# Altium footprint library Pin Header.PcbLib: 138 footprints (part 9 of 9)
Each footprint in its own frame and in the unit in brackets; x right, y up, seen from the top. Pads: shape width x height; smd on the part's side, far side on the other; paste and mask are expansions set on the pad; w line width, h text height; cw(c..) or ccw(c..) is an arc to the next point about the centre after c.
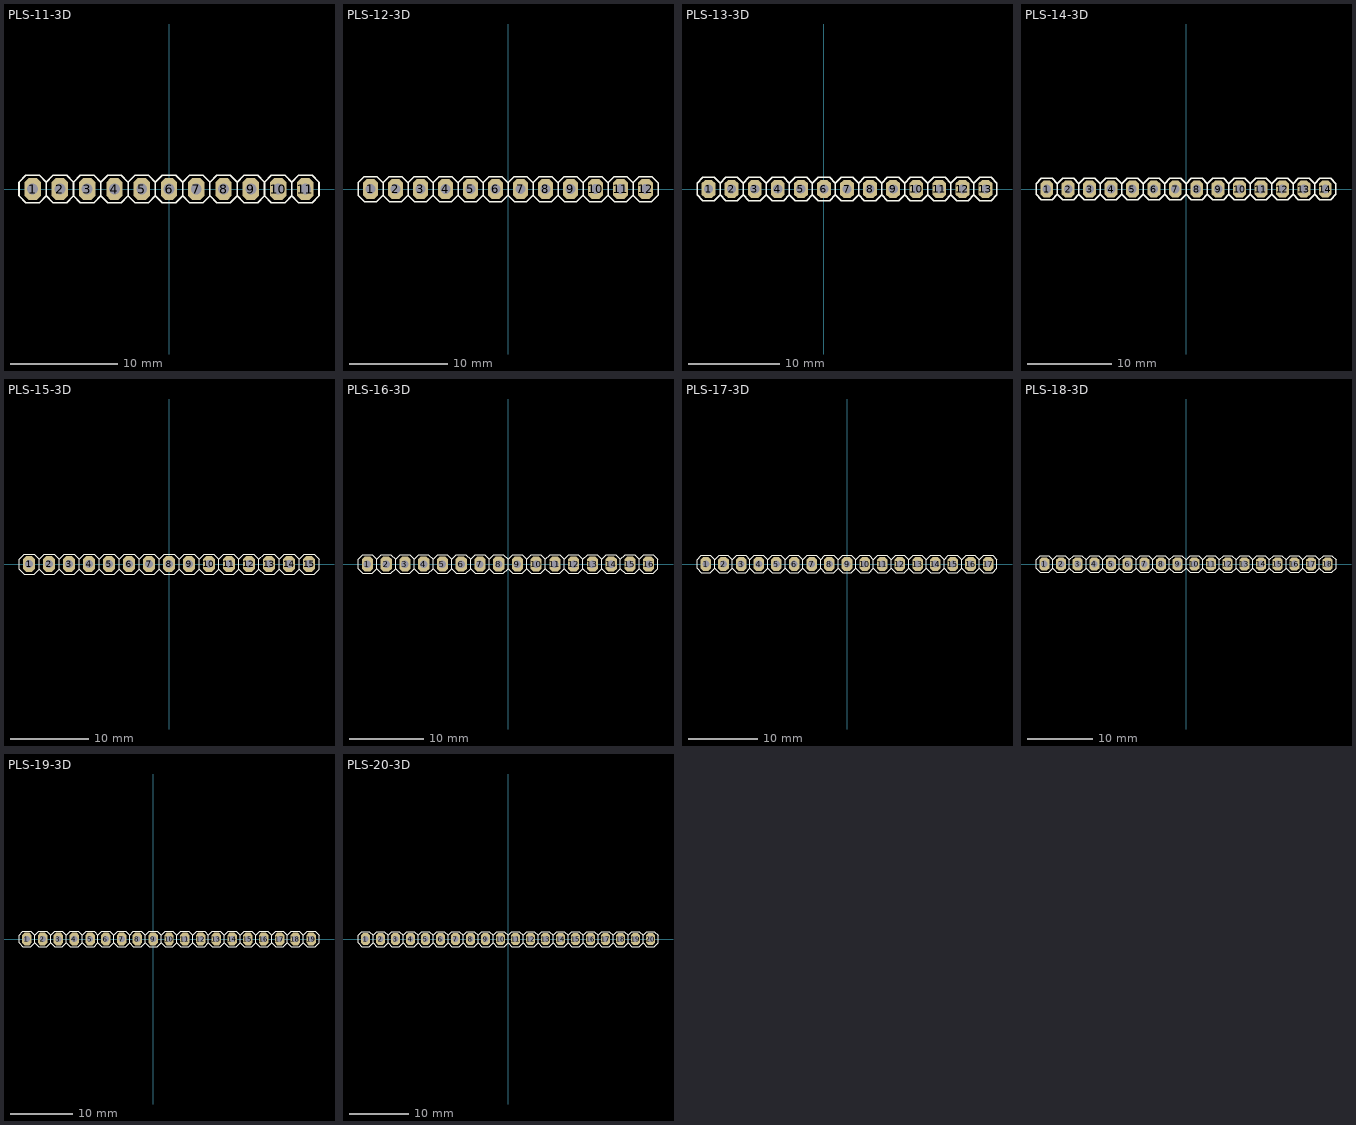
[diagram p8: the footprints below, top view; thin cyan lines are the x and y axes]

## PLS-11-3D [mil] "Connector; Header; 11 Position"
height 295.28
pads (11):
  oct 60x80 hole 40: 1(-500,0) 2(-400,0) 3(-300,0) 4(-200,0) 5(-100,0) 6(0,0) 7(100,0) 8(200,0) 9(300,0) 10(400,0) 11(500,0)
Top Overlay:
  rectangle: 490,-10 510,10
  rectangle: 290,-10 310,10
  rectangle: 90,-10 110,10
  rectangle: -10,-10 10,10
  rectangle: -110,-10 -90,10
  rectangle: -210,-10 -190,10
  rectangle: -310,-10 -290,10
  rectangle: -510,-10 -490,10
  rectangle: -410,-10 -390,10
  rectangle: 190,-10 210,10
  rectangle: 390,-10 410,10
  lines w6: -450,-25 -475,-50 -525,-50 -550,-25 -550,25 -525,50 -475,50 -450,25 ; -450,-25 -450,25 ; -450,-25 -425,-50 -375,-50 -350,-25 ; -450,25 -425,50 -375,50 -350,25 ; -350,-25 -325,-50 -275,-50 -250,-25 ; -350,-25 -350,25 ; -350,25 -325,50 -275,50 -250,25 ; -250,-25 -225,-50 -175,-50 -150,-25 ; -250,-25 -250,25 ; -250,25 -225,50 -175,50 -150,25 ; -150,-25 -125,-50 -75,-50 -50,-25 ; -150,-25 -150,25 ; -150,25 -125,50 -75,50 -50,25 ; -50,-25 -25,-50 25,-50 50,-25 ; -50,-25 -50,25 ; -50,25 -25,50 25,50 50,25 ; 50,-25 75,-50 125,-50 150,-25 ; 50,-25 50,25 ; 50,25 75,50 125,50 150,25 ; 150,-25 150,25 ; 150,-25 175,-50 225,-50 250,-25 ; 150,25 175,50 225,50 250,25 ; 250,-25 275,-50 325,-50 350,-25 ; 250,-25 250,25 ; 250,25 275,50 325,50 350,25 ; 350,-25 350,25 ; 350,-25 375,-50 425,-50 450,-25 ; 350,25 375,50 425,50 450,25 ; 450,-25 475,-50 525,-50 550,-25 550,25 525,50 475,50 450,25 ; 450,-25 450,25
3D body "PLS-1.step": height 336.22, standoff -114.17, extent 451,-49.99 551,50.01
3D body "PLS-1.step": height 336.22, standoff -114.17, extent 251,-49.99 351,50.01
3D body "PLS-1.step": height 336.22, standoff -114.17, extent 51,-49.99 151,50.01
3D body "PLS-1.step": height 336.22, standoff -114.17, extent -49,-49.99 51,50.01
3D body "PLS-1.step": height 336.22, standoff -114.17, extent -149,-49.99 -49,50.01
3D body "PLS-1.step": height 336.22, standoff -114.17, extent -249,-49.99 -149,50.01
3D body "PLS-1.step": height 336.22, standoff -114.17, extent -349,-49.99 -249,50.01
3D body "PLS-1.step": height 336.22, standoff -114.17, extent -549,-49.99 -449,50.01
3D body "PLS-1.step": height 336.22, standoff -114.17, extent -449,-49.99 -349,50.01
3D body "PLS-1.step": height 336.22, standoff -114.17, extent 151,-49.99 251,50.01
3D body "PLS-1.step": height 336.22, standoff -114.17, extent 351,-49.99 451,50.01

## PLS-12-3D [mil] "Connector; Header; 12 Position"
height 295.28
pads (12):
  oct 60x80 hole 40: 1(-550,0) 2(-450,0) 3(-350,0) 4(-250,0) 5(-150,0) 6(-50,0) 7(50,0) 8(150,0) 9(250,0) 10(350,0) 11(450,0) 12(550,0)
Top Overlay:
  rectangle: 540,-10 560,10
  rectangle: 340,-10 360,10
  rectangle: 140,-10 160,10
  rectangle: -460,-10 -440,10
  rectangle: -560,-10 -540,10
  rectangle: -360,-10 -340,10
  rectangle: -260,-10 -240,10
  rectangle: -160,-10 -140,10
  rectangle: -60,-10 -40,10
  rectangle: 40,-10 60,10
  rectangle: 240,-10 260,10
  rectangle: 440,-10 460,10
  lines w6: -500,-25 -475,-50 -425,-50 -400,-25 ; -500,-25 -500,25 ; -500,-25 -525,-50 -575,-50 -600,-25 -600,25 -575,50 -525,50 -500,25 ; -500,25 -475,50 -425,50 -400,25 ; -400,-25 -400,25 ; -400,-25 -375,-50 -325,-50 -300,-25 ; -400,25 -375,50 -325,50 -300,25 ; -300,-25 -300,25 ; -300,-25 -275,-50 -225,-50 -200,-25 ; -300,25 -275,50 -225,50 -200,25 ; -200,-25 -200,25 ; -200,-25 -175,-50 -125,-50 -100,-25 ; -200,25 -175,50 -125,50 -100,25 ; -100,-25 -100,25 ; -100,-25 -75,-50 -25,-50 0,-25 ; -100,25 -75,50 -25,50 0,25 ; 0,-25 0,25 ; 0,-25 25,-50 75,-50 100,-25 ; 0,25 25,50 75,50 100,25 ; 100,-25 125,-50 175,-50 200,-25 ; 100,-25 100,25 ; 100,25 125,50 175,50 200,25 ; 200,-25 200,25 ; 200,-25 225,-50 275,-50 300,-25 ; 200,25 225,50 275,50 300,25 ; 300,-25 325,-50 375,-50 400,-25 ; 300,-25 300,25 ; 300,25 325,50 375,50 400,25 ; 400,-25 400,25 ; 400,-25 425,-50 475,-50 500,-25 ; 400,25 425,50 475,50 500,25 ; 500,-25 525,-50 575,-50 600,-25 600,25 575,50 525,50 500,25 ; 500,-25 500,25
3D body "PLS-1.step": height 336.22, standoff -114.17, extent 501,-49.99 601,50.01
3D body "PLS-1.step": height 336.22, standoff -114.17, extent 301,-49.99 401,50.01
3D body "PLS-1.step": height 336.22, standoff -114.17, extent 101,-49.99 201,50.01
3D body "PLS-1.step": height 336.22, standoff -114.17, extent -499,-49.99 -399,50.01
3D body "PLS-1.step": height 336.22, standoff -114.17, extent -599,-49.99 -499,50.01
3D body "PLS-1.step": height 336.22, standoff -114.17, extent -399,-49.99 -299,50.01
3D body "PLS-1.step": height 336.22, standoff -114.17, extent -299,-49.99 -199,50.01
3D body "PLS-1.step": height 336.22, standoff -114.17, extent -199,-49.99 -99,50.01
3D body "PLS-1.step": height 336.22, standoff -114.17, extent -99,-49.99 1,50.01
3D body "PLS-1.step": height 336.22, standoff -114.17, extent 1,-49.99 101,50.01
3D body "PLS-1.step": height 336.22, standoff -114.17, extent 201,-49.99 301,50.01
3D body "PLS-1.step": height 336.22, standoff -114.17, extent 401,-49.99 501,50.01

## PLS-13-3D [mil] "Connector; Header; 13 Position"
height 295.28
pads (13):
  oct 60x80 hole 40: 1(-500,0) 2(-400,0) 3(-300,0) 4(-200,0) 5(-100,0) 6(0,0) 7(100,0) 8(200,0) 9(300,0) 10(400,0) 11(500,0) 12(600,0) 13(700,0)
Top Overlay:
  rectangle: 490,-10 510,10
  rectangle: 290,-10 310,10
  rectangle: 90,-10 110,10
  rectangle: -10,-10 10,10
  rectangle: -110,-10 -90,10
  rectangle: -210,-10 -190,10
  rectangle: -310,-10 -290,10
  rectangle: -510,-10 -490,10
  rectangle: -410,-10 -390,10
  rectangle: 190,-10 210,10
  rectangle: 390,-10 410,10
  rectangle: 590,-10 610,10
  rectangle: 690,-10 710,10
  lines w6: -450,-25 -475,-50 -525,-50 -550,-25 -550,25 -525,50 -475,50 -450,25 ; -450,-25 -450,25 ; -450,-25 -425,-50 -375,-50 -350,-25 ; -450,25 -425,50 -375,50 -350,25 ; -350,-25 -325,-50 -275,-50 -250,-25 ; -350,-25 -350,25 ; -350,25 -325,50 -275,50 -250,25 ; -250,-25 -225,-50 -175,-50 -150,-25 ; -250,-25 -250,25 ; -250,25 -225,50 -175,50 -150,25 ; -150,-25 -125,-50 -75,-50 -50,-25 ; -150,-25 -150,25 ; -150,25 -125,50 -75,50 -50,25 ; -50,-25 -25,-50 25,-50 50,-25 ; -50,-25 -50,25 ; -50,25 -25,50 25,50 50,25 ; 50,-25 75,-50 125,-50 150,-25 ; 50,-25 50,25 ; 50,25 75,50 125,50 150,25 ; 150,-25 150,25 ; 150,-25 175,-50 225,-50 250,-25 ; 150,25 175,50 225,50 250,25 ; 250,-25 275,-50 325,-50 350,-25 ; 250,-25 250,25 ; 250,25 275,50 325,50 350,25 ; 350,-25 350,25 ; 350,-25 375,-50 425,-50 450,-25 ; 350,25 375,50 425,50 450,25 ; 450,-25 475,-50 525,-50 550,-25 ; 450,-25 450,25 ; 450,25 475,50 525,50 550,25 ; 550,-25 550,25 ; 550,-25 575,-50 625,-50 650,-25 ; 550,25 575,50 625,50 650,25 ; 650,-25 650,25 ; 650,-25 675,-50 725,-50 750,-25 750,25 725,50 675,50 650,25
3D body "PLS-1.step": height 336.22, standoff -114.17, extent 451,-49.99 551,50.01
3D body "PLS-1.step": height 336.22, standoff -114.17, extent 251,-49.99 351,50.01
3D body "PLS-1.step": height 336.22, standoff -114.17, extent 51,-49.99 151,50.01
3D body "PLS-1.step": height 336.22, standoff -114.17, extent -49,-49.99 51,50.01
3D body "PLS-1.step": height 336.22, standoff -114.17, extent -149,-49.99 -49,50.01
3D body "PLS-1.step": height 336.22, standoff -114.17, extent -249,-49.99 -149,50.01
3D body "PLS-1.step": height 336.22, standoff -114.17, extent -349,-49.99 -249,50.01
3D body "PLS-1.step": height 336.22, standoff -114.17, extent -549,-49.99 -449,50.01
3D body "PLS-1.step": height 336.22, standoff -114.17, extent -449,-49.99 -349,50.01
3D body "PLS-1.step": height 336.22, standoff -114.17, extent 151,-49.99 251,50.01
3D body "PLS-1.step": height 336.22, standoff -114.17, extent 351,-49.99 451,50.01
3D body "PLS-1.step": height 336.22, standoff -114.17, extent 551,-49.99 651,50.01
3D body "PLS-1.step": height 336.22, standoff -114.17, extent 651,-49.99 751,50.01

## PLS-14-3D [mil] "Connector; Header; 14 Position"
height 295.28
pads (14):
  oct 60x80 hole 40: 1(-650,0) 2(-550,0) 3(-450,0) 4(-350,0) 5(-250,0) 6(-150,0) 7(-50,0) 8(50,0) 9(150,0) 10(250,0) 11(350,0) 12(450,0) 13(550,0) 14(650,0)
Top Overlay:
  rectangle: 540,-10 560,10
  rectangle: 440,-10 460,10
  rectangle: 240,-10 260,10
  rectangle: 40,-10 60,10
  rectangle: -560,-10 -540,10
  rectangle: -660,-10 -640,10
  rectangle: -460,-10 -440,10
  rectangle: -360,-10 -340,10
  rectangle: -260,-10 -240,10
  rectangle: -160,-10 -140,10
  rectangle: -60,-10 -40,10
  rectangle: 140,-10 160,10
  rectangle: 340,-10 360,10
  rectangle: 640,-10 660,10
  lines w6: -600,-25 -575,-50 -525,-50 -500,-25 ; -600,-25 -600,25 ; -600,-25 -625,-50 -675,-50 -700,-25 -700,25 -675,50 -625,50 -600,25 ; -600,25 -575,50 -525,50 -500,25 ; -500,-25 -500,25 ; -500,-25 -475,-50 -425,-50 -400,-25 ; -500,25 -475,50 -425,50 -400,25 ; -400,-25 -400,25 ; -400,-25 -375,-50 -325,-50 -300,-25 ; -400,25 -375,50 -325,50 -300,25 ; -300,-25 -300,25 ; -300,-25 -275,-50 -225,-50 -200,-25 ; -300,25 -275,50 -225,50 -200,25 ; -200,-25 -200,25 ; -200,-25 -175,-50 -125,-50 -100,-25 ; -200,25 -175,50 -125,50 -100,25 ; -100,-25 -100,25 ; -100,-25 -75,-50 -25,-50 0,-25 ; -100,25 -75,50 -25,50 0,25 ; 0,-25 25,-50 75,-50 100,-25 ; 0,-25 0,25 ; 0,25 25,50 75,50 100,25 ; 100,-25 100,25 ; 100,-25 125,-50 175,-50 200,-25 ; 100,25 125,50 175,50 200,25 ; 200,-25 225,-50 275,-50 300,-25 ; 200,-25 200,25 ; 200,25 225,50 275,50 300,25 ; 300,-25 300,25 ; 300,-25 325,-50 375,-50 400,-25 ; 300,25 325,50 375,50 400,25 ; 400,-25 425,-50 475,-50 500,-25 ; 400,-25 400,25 ; 400,25 425,50 475,50 500,25 ; 500,-25 525,-50 575,-50 600,-25 ; 500,-25 500,25 ; 500,25 525,50 575,50 600,25 ; 600,-25 600,25 ; 600,-25 625,-50 675,-50 700,-25 700,25 675,50 625,50 600,25
3D body "PLS-1.step": height 336.22, standoff -114.17, extent 501,-49.99 601,50.01
3D body "PLS-1.step": height 336.22, standoff -114.17, extent 401,-49.99 501,50.01
3D body "PLS-1.step": height 336.22, standoff -114.17, extent 201,-49.99 301,50.01
3D body "PLS-1.step": height 336.22, standoff -114.17, extent 1,-49.99 101,50.01
3D body "PLS-1.step": height 336.22, standoff -114.17, extent -599,-49.99 -499,50.01
3D body "PLS-1.step": height 336.22, standoff -114.17, extent -699,-49.99 -599,50.01
3D body "PLS-1.step": height 336.22, standoff -114.17, extent -499,-49.99 -399,50.01
3D body "PLS-1.step": height 336.22, standoff -114.17, extent -399,-49.99 -299,50.01
3D body "PLS-1.step": height 336.22, standoff -114.17, extent -299,-49.99 -199,50.01
3D body "PLS-1.step": height 336.22, standoff -114.17, extent -199,-49.99 -99,50.01
3D body "PLS-1.step": height 336.22, standoff -114.17, extent -99,-49.99 1,50.01
3D body "PLS-1.step": height 336.22, standoff -114.17, extent 101,-49.99 201,50.01
3D body "PLS-1.step": height 336.22, standoff -114.17, extent 301,-49.99 401,50.01
3D body "PLS-1.step": height 336.22, standoff -114.17, extent 601,-49.99 701,50.01

## PLS-15-3D [mil] "Connector; Header; 15 Position"
height 295.28
pads (15):
  oct 60x80 hole 40: 1(-700,0) 2(-600,0) 3(-500,0) 4(-400,0) 5(-300,0) 6(-200,0) 7(-100,0) 8(0,0) 9(100,0) 10(200,0) 11(300,0) 12(400,0) 13(500,0) 14(600,0) 15(700,0)
Top Overlay:
  rectangle: 590,-10 610,10
  rectangle: 290,-10 310,10
  rectangle: 90,-10 110,10
  rectangle: -110,-10 -90,10
  rectangle: -210,-10 -190,10
  rectangle: -310,-10 -290,10
  rectangle: -410,-10 -390,10
  rectangle: -510,-10 -490,10
  rectangle: -710,-10 -690,10
  rectangle: -610,-10 -590,10
  rectangle: -10,-10 10,10
  rectangle: 190,-10 210,10
  rectangle: 390,-10 410,10
  rectangle: 490,-10 510,10
  rectangle: 690,-10 710,10
  lines w6: -650,-25 -675,-50 -725,-50 -750,-25 -750,25 -725,50 -675,50 -650,25 ; -650,-25 -650,25 ; -650,-25 -625,-50 -575,-50 -550,-25 ; -650,25 -625,50 -575,50 -550,25 ; -550,-25 -525,-50 -475,-50 -450,-25 ; -550,-25 -550,25 ; -550,25 -525,50 -475,50 -450,25 ; -450,-25 -425,-50 -375,-50 -350,-25 ; -450,-25 -450,25 ; -450,25 -425,50 -375,50 -350,25 ; -350,-25 -325,-50 -275,-50 -250,-25 ; -350,-25 -350,25 ; -350,25 -325,50 -275,50 -250,25 ; -250,-25 -225,-50 -175,-50 -150,-25 ; -250,-25 -250,25 ; -250,25 -225,50 -175,50 -150,25 ; -150,-25 -125,-50 -75,-50 -50,-25 ; -150,-25 -150,25 ; -150,25 -125,50 -75,50 -50,25 ; -50,-25 -50,25 ; -50,-25 -25,-50 25,-50 50,-25 ; -50,25 -25,50 25,50 50,25 ; 50,-25 75,-50 125,-50 150,-25 ; 50,-25 50,25 ; 50,25 75,50 125,50 150,25 ; 150,-25 150,25 ; 150,-25 175,-50 225,-50 250,-25 ; 150,25 175,50 225,50 250,25 ; 250,-25 275,-50 325,-50 350,-25 ; 250,-25 250,25 ; 250,25 275,50 325,50 350,25 ; 350,-25 350,25 ; 350,-25 375,-50 425,-50 450,-25 ; 350,25 375,50 425,50 450,25 ; 450,-25 450,25 ; 450,-25 475,-50 525,-50 550,-25 ; 450,25 475,50 525,50 550,25 ; 550,-25 575,-50 625,-50 650,-25 ; 550,-25 550,25 ; 550,25 575,50 625,50 650,25 ; 650,-25 650,25 ; 650,-25 675,-50 725,-50 750,-25 750,25 725,50 675,50 650,25
3D body "PLS-1.step": height 336.22, standoff -114.17, extent 551,-49.99 651,50.01
3D body "PLS-1.step": height 336.22, standoff -114.17, extent 251,-49.99 351,50.01
3D body "PLS-1.step": height 336.22, standoff -114.17, extent 51,-49.99 151,50.01
3D body "PLS-1.step": height 336.22, standoff -114.17, extent -149,-49.99 -49,50.01
3D body "PLS-1.step": height 336.22, standoff -114.17, extent -249,-49.99 -149,50.01
3D body "PLS-1.step": height 336.22, standoff -114.17, extent -349,-49.99 -249,50.01
3D body "PLS-1.step": height 336.22, standoff -114.17, extent -449,-49.99 -349,50.01
3D body "PLS-1.step": height 336.22, standoff -114.17, extent -549,-49.99 -449,50.01
3D body "PLS-1.step": height 336.22, standoff -114.17, extent -749,-49.99 -649,50.01
3D body "PLS-1.step": height 336.22, standoff -114.17, extent -649,-49.99 -549,50.01
3D body "PLS-1.step": height 336.22, standoff -114.17, extent -49,-49.99 51,50.01
3D body "PLS-1.step": height 336.22, standoff -114.17, extent 151,-49.99 251,50.01
3D body "PLS-1.step": height 336.22, standoff -114.17, extent 351,-49.99 451,50.01
3D body "PLS-1.step": height 336.22, standoff -114.17, extent 451,-49.99 551,50.01
3D body "PLS-1.step": height 336.22, standoff -114.17, extent 651,-49.99 751,50.01

## PLS-16-3D [mil] "Connector; Header; 16 Position"
height 295.28
pads (16):
  oct 60x80 hole 40: 1(-750,0) 2(-650,0) 3(-550,0) 4(-450,0) 5(-350,0) 6(-250,0) 7(-150,0) 8(-50,0) 9(50,0) 10(150,0) 11(250,0) 12(350,0) 13(450,0) 14(550,0) 15(650,0) 16(750,0)
Top Overlay:
  rectangle: 640,-10 660,10
  rectangle: 440,-10 460,10
  rectangle: 340,-10 360,10
  rectangle: 140,-10 160,10
  rectangle: -60,-10 -40,10
  rectangle: -660,-10 -640,10
  rectangle: -760,-10 -740,10
  rectangle: -560,-10 -540,10
  rectangle: -460,-10 -440,10
  rectangle: -360,-10 -340,10
  rectangle: -260,-10 -240,10
  rectangle: -160,-10 -140,10
  rectangle: 40,-10 60,10
  rectangle: 240,-10 260,10
  rectangle: 540,-10 560,10
  rectangle: 740,-10 760,10
  lines w6: -700,-25 -675,-50 -625,-50 -600,-25 ; -700,-25 -700,25 ; -700,-25 -725,-50 -775,-50 -800,-25 -800,25 -775,50 -725,50 -700,25 ; -700,25 -675,50 -625,50 -600,25 ; -600,-25 -600,25 ; -600,-25 -575,-50 -525,-50 -500,-25 ; -600,25 -575,50 -525,50 -500,25 ; -500,-25 -500,25 ; -500,-25 -475,-50 -425,-50 -400,-25 ; -500,25 -475,50 -425,50 -400,25 ; -400,-25 -400,25 ; -400,-25 -375,-50 -325,-50 -300,-25 ; -400,25 -375,50 -325,50 -300,25 ; -300,-25 -300,25 ; -300,-25 -275,-50 -225,-50 -200,-25 ; -300,25 -275,50 -225,50 -200,25 ; -200,-25 -200,25 ; -200,-25 -175,-50 -125,-50 -100,-25 ; -200,25 -175,50 -125,50 -100,25 ; -100,-25 -75,-50 -25,-50 0,-25 ; -100,-25 -100,25 ; -100,25 -75,50 -25,50 0,25 ; 0,-25 0,25 ; 0,-25 25,-50 75,-50 100,-25 ; 0,25 25,50 75,50 100,25 ; 100,-25 125,-50 175,-50 200,-25 ; 100,-25 100,25 ; 100,25 125,50 175,50 200,25 ; 200,-25 200,25 ; 200,-25 225,-50 275,-50 300,-25 ; 200,25 225,50 275,50 300,25 ; 300,-25 325,-50 375,-50 400,-25 ; 300,-25 300,25 ; 300,25 325,50 375,50 400,25 ; 400,-25 425,-50 475,-50 500,-25 ; 400,-25 400,25 ; 400,25 425,50 475,50 500,25 ; 500,-25 500,25 ; 500,-25 525,-50 575,-50 600,-25 ; 500,25 525,50 575,50 600,25 ; 600,-25 625,-50 675,-50 700,-25 ; 600,-25 600,25 ; 600,25 625,50 675,50 700,25 ; 700,-25 700,25 ; 700,-25 725,-50 775,-50 800,-25 800,25 775,50 725,50 700,25
3D body "PLS-1.step": height 336.22, standoff -114.17, extent 601,-49.99 701,50.01
3D body "PLS-1.step": height 336.22, standoff -114.17, extent 401,-49.99 501,50.01
3D body "PLS-1.step": height 336.22, standoff -114.17, extent 301,-49.99 401,50.01
3D body "PLS-1.step": height 336.22, standoff -114.17, extent 101,-49.99 201,50.01
3D body "PLS-1.step": height 336.22, standoff -114.17, extent -99,-49.99 1,50.01
3D body "PLS-1.step": height 336.22, standoff -114.17, extent -699,-49.99 -599,50.01
3D body "PLS-1.step": height 336.22, standoff -114.17, extent -799,-49.99 -699,50.01
3D body "PLS-1.step": height 336.22, standoff -114.17, extent -599,-49.99 -499,50.01
3D body "PLS-1.step": height 336.22, standoff -114.17, extent -499,-49.99 -399,50.01
3D body "PLS-1.step": height 336.22, standoff -114.17, extent -399,-49.99 -299,50.01
3D body "PLS-1.step": height 336.22, standoff -114.17, extent -299,-49.99 -199,50.01
3D body "PLS-1.step": height 336.22, standoff -114.17, extent -199,-49.99 -99,50.01
3D body "PLS-1.step": height 336.22, standoff -114.17, extent 1,-49.99 101,50.01
3D body "PLS-1.step": height 336.22, standoff -114.17, extent 201,-49.99 301,50.01
3D body "PLS-1.step": height 336.22, standoff -114.17, extent 501,-49.99 601,50.01
3D body "PLS-1.step": height 336.22, standoff -114.17, extent 701,-49.99 801,50.01

## PLS-17-3D [mil] "Connector; Header; 17 Position"
height 295.28
pads (17):
  oct 60x80 hole 40: 1(-800,0) 2(-700,0) 3(-600,0) 4(-500,0) 5(-400,0) 6(-300,0) 7(-200,0) 8(-100,0) 9(0,0) 10(100,0) 11(200,0) 12(300,0) 13(400,0) 14(500,0) 15(600,0) 16(700,0) 17(800,0)
Top Overlay:
  rectangle: 690,-10 710,10
  rectangle: 490,-10 510,10
  rectangle: 190,-10 210,10
  rectangle: -10,-10 10,10
  rectangle: -210,-10 -190,10
  rectangle: -310,-10 -290,10
  rectangle: -410,-10 -390,10
  rectangle: -510,-10 -490,10
  rectangle: -610,-10 -590,10
  rectangle: -810,-10 -790,10
  rectangle: -710,-10 -690,10
  rectangle: -110,-10 -90,10
  rectangle: 90,-10 110,10
  rectangle: 290,-10 310,10
  rectangle: 390,-10 410,10
  rectangle: 590,-10 610,10
  rectangle: 790,-10 810,10
  lines w6: -750,-25 -775,-50 -825,-50 -850,-25 -850,25 -825,50 -775,50 -750,25 ; -750,-25 -750,25 ; -750,-25 -725,-50 -675,-50 -650,-25 ; -750,25 -725,50 -675,50 -650,25 ; -650,-25 -625,-50 -575,-50 -550,-25 ; -650,-25 -650,25 ; -650,25 -625,50 -575,50 -550,25 ; -550,-25 -525,-50 -475,-50 -450,-25 ; -550,-25 -550,25 ; -550,25 -525,50 -475,50 -450,25 ; -450,-25 -425,-50 -375,-50 -350,-25 ; -450,-25 -450,25 ; -450,25 -425,50 -375,50 -350,25 ; -350,-25 -325,-50 -275,-50 -250,-25 ; -350,-25 -350,25 ; -350,25 -325,50 -275,50 -250,25 ; -250,-25 -225,-50 -175,-50 -150,-25 ; -250,-25 -250,25 ; -250,25 -225,50 -175,50 -150,25 ; -150,-25 -150,25 ; -150,-25 -125,-50 -75,-50 -50,-25 ; -150,25 -125,50 -75,50 -50,25 ; -50,-25 -25,-50 25,-50 50,-25 ; -50,-25 -50,25 ; -50,25 -25,50 25,50 50,25 ; 50,-25 50,25 ; 50,-25 75,-50 125,-50 150,-25 ; 50,25 75,50 125,50 150,25 ; 150,-25 175,-50 225,-50 250,-25 ; 150,-25 150,25 ; 150,25 175,50 225,50 250,25 ; 250,-25 250,25 ; 250,-25 275,-50 325,-50 350,-25 ; 250,25 275,50 325,50 350,25 ; 350,-25 350,25 ; 350,-25 375,-50 425,-50 450,-25 ; 350,25 375,50 425,50 450,25 ; 450,-25 475,-50 525,-50 550,-25 ; 450,-25 450,25 ; 450,25 475,50 525,50 550,25 ; 550,-25 550,25 ; 550,-25 575,-50 625,-50 650,-25 ; 550,25 575,50 625,50 650,25 ; 650,-25 675,-50 725,-50 750,-25 ; 650,-25 650,25 ; 650,25 675,50 725,50 750,25 ; 750,-25 750,25 ; 750,-25 775,-50 825,-50 850,-25 850,25 825,50 775,50 750,25
3D body "PLS-1.step": height 336.22, standoff -114.17, extent 651,-49.99 751,50.01
3D body "PLS-1.step": height 336.22, standoff -114.17, extent 451,-49.99 551,50.01
3D body "PLS-1.step": height 336.22, standoff -114.17, extent 151,-49.99 251,50.01
3D body "PLS-1.step": height 336.22, standoff -114.17, extent -49,-49.99 51,50.01
3D body "PLS-1.step": height 336.22, standoff -114.17, extent -249,-49.99 -149,50.01
3D body "PLS-1.step": height 336.22, standoff -114.17, extent -349,-49.99 -249,50.01
3D body "PLS-1.step": height 336.22, standoff -114.17, extent -449,-49.99 -349,50.01
3D body "PLS-1.step": height 336.22, standoff -114.17, extent -549,-49.99 -449,50.01
3D body "PLS-1.step": height 336.22, standoff -114.17, extent -649,-49.99 -549,50.01
3D body "PLS-1.step": height 336.22, standoff -114.17, extent -849,-49.99 -749,50.01
3D body "PLS-1.step": height 336.22, standoff -114.17, extent -749,-49.99 -649,50.01
3D body "PLS-1.step": height 336.22, standoff -114.17, extent -149,-49.99 -49,50.01
3D body "PLS-1.step": height 336.22, standoff -114.17, extent 51,-49.99 151,50.01
3D body "PLS-1.step": height 336.22, standoff -114.17, extent 251,-49.99 351,50.01
3D body "PLS-1.step": height 336.22, standoff -114.17, extent 351,-49.99 451,50.01
3D body "PLS-1.step": height 336.22, standoff -114.17, extent 551,-49.99 651,50.01
3D body "PLS-1.step": height 336.22, standoff -114.17, extent 751,-49.99 851,50.01

## PLS-18-3D [mil] "Connector; Header; 18 Position"
height 295.28
pads (18):
  oct 60x80 hole 40: 1(-850,0) 2(-750,0) 3(-650,0) 4(-550,0) 5(-450,0) 6(-350,0) 7(-250,0) 8(-150,0) 9(-50,0) 10(50,0) 11(150,0) 12(250,0) 13(350,0) 14(450,0) 15(550,0) 16(650,0) 17(750,0) 18(850,0)
Top Overlay:
  rectangle: 740,-10 760,10
  rectangle: 540,-10 560,10
  rectangle: 340,-10 360,10
  rectangle: 240,-10 260,10
  rectangle: 40,-10 60,10
  rectangle: -160,-10 -140,10
  rectangle: -760,-10 -740,10
  rectangle: -860,-10 -840,10
  rectangle: -660,-10 -640,10
  rectangle: -560,-10 -540,10
  rectangle: -460,-10 -440,10
  rectangle: -360,-10 -340,10
  rectangle: -260,-10 -240,10
  rectangle: -60,-10 -40,10
  rectangle: 140,-10 160,10
  rectangle: 440,-10 460,10
  rectangle: 640,-10 660,10
  rectangle: 840,-10 860,10
  lines w6: -800,-25 -775,-50 -725,-50 -700,-25 ; -800,-25 -800,25 ; -800,-25 -825,-50 -875,-50 -900,-25 -900,25 -875,50 -825,50 -800,25 ; -800,25 -775,50 -725,50 -700,25 ; -700,-25 -700,25 ; -700,-25 -675,-50 -625,-50 -600,-25 ; -700,25 -675,50 -625,50 -600,25 ; -600,-25 -600,25 ; -600,-25 -575,-50 -525,-50 -500,-25 ; -600,25 -575,50 -525,50 -500,25 ; -500,-25 -500,25 ; -500,-25 -475,-50 -425,-50 -400,-25 ; -500,25 -475,50 -425,50 -400,25 ; -400,-25 -400,25 ; -400,-25 -375,-50 -325,-50 -300,-25 ; -400,25 -375,50 -325,50 -300,25 ; -300,-25 -300,25 ; -300,-25 -275,-50 -225,-50 -200,-25 ; -300,25 -275,50 -225,50 -200,25 ; -200,-25 -175,-50 -125,-50 -100,-25 ; -200,-25 -200,25 ; -200,25 -175,50 -125,50 -100,25 ; -100,-25 -100,25 ; -100,-25 -75,-50 -25,-50 0,-25 ; -100,25 -75,50 -25,50 0,25 ; 0,-25 25,-50 75,-50 100,-25 ; 0,-25 0,25 ; 0,25 25,50 75,50 100,25 ; 100,-25 100,25 ; 100,-25 125,-50 175,-50 200,-25 ; 100,25 125,50 175,50 200,25 ; 200,-25 225,-50 275,-50 300,-25 ; 200,-25 200,25 ; 200,25 225,50 275,50 300,25 ; 300,-25 325,-50 375,-50 400,-25 ; 300,-25 300,25 ; 300,25 325,50 375,50 400,25 ; 400,-25 400,25 ; 400,-25 425,-50 475,-50 500,-25 ; 400,25 425,50 475,50 500,25 ; 500,-25 525,-50 575,-50 600,-25 ; 500,-25 500,25 ; 500,25 525,50 575,50 600,25 ; 600,-25 600,25 ; 600,-25 625,-50 675,-50 700,-25 ; 600,25 625,50 675,50 700,25 ; 700,-25 725,-50 775,-50 800,-25 ; 700,-25 700,25 ; 700,25 725,50 775,50 800,25 ; 800,-25 800,25 ; 800,-25 825,-50 875,-50 900,-25 900,25 875,50 825,50 800,25
3D body "PLS-1.step": height 336.22, standoff -114.17, extent 701,-49.99 801,50.01
3D body "PLS-1.step": height 336.22, standoff -114.17, extent 501,-49.99 601,50.01
3D body "PLS-1.step": height 336.22, standoff -114.17, extent 301,-49.99 401,50.01
3D body "PLS-1.step": height 336.22, standoff -114.17, extent 201,-49.99 301,50.01
3D body "PLS-1.step": height 336.22, standoff -114.17, extent 1,-49.99 101,50.01
3D body "PLS-1.step": height 336.22, standoff -114.17, extent -199,-49.99 -99,50.01
3D body "PLS-1.step": height 336.22, standoff -114.17, extent -799,-49.99 -699,50.01
3D body "PLS-1.step": height 336.22, standoff -114.17, extent -899,-49.99 -799,50.01
3D body "PLS-1.step": height 336.22, standoff -114.17, extent -699,-49.99 -599,50.01
3D body "PLS-1.step": height 336.22, standoff -114.17, extent -599,-49.99 -499,50.01
3D body "PLS-1.step": height 336.22, standoff -114.17, extent -499,-49.99 -399,50.01
3D body "PLS-1.step": height 336.22, standoff -114.17, extent -399,-49.99 -299,50.01
3D body "PLS-1.step": height 336.22, standoff -114.17, extent -299,-49.99 -199,50.01
3D body "PLS-1.step": height 336.22, standoff -114.17, extent -99,-49.99 1,50.01
3D body "PLS-1.step": height 336.22, standoff -114.17, extent 101,-49.99 201,50.01
3D body "PLS-1.step": height 336.22, standoff -114.17, extent 401,-49.99 501,50.01
3D body "PLS-1.step": height 336.22, standoff -114.17, extent 601,-49.99 701,50.01
3D body "PLS-1.step": height 336.22, standoff -114.17, extent 801,-49.99 901,50.01

## PLS-19-3D [mil] "Connector; Header; 19 Position"
height 295.28
pads (19):
  oct 60x80 hole 40: 1(-800,0) 2(-700,0) 3(-600,0) 4(-500,0) 5(-400,0) 6(-300,0) 7(-200,0) 8(-100,0) 9(0,0) 10(100,0) 11(200,0) 12(300,0) 13(400,0) 14(500,0) 15(600,0) 16(700,0) 17(800,0) 18(900,0) 19(1000,0)
Top Overlay:
  drawing of 153 lines, arcs and shapes, not listed
3D body "PLS-1.step": height 336.22, standoff -114.17, extent 851,-49.99 951,50.01
3D body "PLS-1.step": height 336.22, standoff -114.17, extent 651,-49.99 751,50.01
3D body "PLS-1.step": height 336.22, standoff -114.17, extent 451,-49.99 551,50.01
3D body "PLS-1.step": height 336.22, standoff -114.17, extent 151,-49.99 251,50.01
3D body "PLS-1.step": height 336.22, standoff -114.17, extent -49,-49.99 51,50.01
3D body "PLS-1.step": height 336.22, standoff -114.17, extent -249,-49.99 -149,50.01
3D body "PLS-1.step": height 336.22, standoff -114.17, extent -349,-49.99 -249,50.01
3D body "PLS-1.step": height 336.22, standoff -114.17, extent -449,-49.99 -349,50.01
3D body "PLS-1.step": height 336.22, standoff -114.17, extent -549,-49.99 -449,50.01
3D body "PLS-1.step": height 336.22, standoff -114.17, extent -649,-49.99 -549,50.01
3D body "PLS-1.step": height 336.22, standoff -114.17, extent -849,-49.99 -749,50.01
3D body "PLS-1.step": height 336.22, standoff -114.17, extent -749,-49.99 -649,50.01
3D body "PLS-1.step": height 336.22, standoff -114.17, extent -149,-49.99 -49,50.01
3D body "PLS-1.step": height 336.22, standoff -114.17, extent 51,-49.99 151,50.01
3D body "PLS-1.step": height 336.22, standoff -114.17, extent 251,-49.99 351,50.01
3D body "PLS-1.step": height 336.22, standoff -114.17, extent 351,-49.99 451,50.01
3D body "PLS-1.step": height 336.22, standoff -114.17, extent 551,-49.99 651,50.01
3D body "PLS-1.step": height 336.22, standoff -114.17, extent 751,-49.99 851,50.01
3D body "PLS-1.step": height 336.22, standoff -114.17, extent 951,-49.99 1051,50.01

## PLS-20-3D [mil] "Connector; Header; 20 Position"
height 295.28
pads (20):
  oct 60x80 hole 40: 1(-950,0) 2(-850,0) 3(-750,0) 4(-650,0) 5(-550,0) 6(-450,0) 7(-350,0) 8(-250,0) 9(-150,0) 10(-50,0) 11(50,0) 12(150,0) 13(250,0) 14(350,0) 15(450,0) 16(550,0) 17(650,0) 18(750,0) 19(850,0) 20(950,0)
Top Overlay:
  drawing of 161 lines, arcs and shapes, not listed
3D body "PLS-1.step": height 336.22, standoff -114.17, extent 801,-49.99 901,50.01
3D body "PLS-1.step": height 336.22, standoff -114.17, extent 601,-49.99 701,50.01
3D body "PLS-1.step": height 336.22, standoff -114.17, extent 401,-49.99 501,50.01
3D body "PLS-1.step": height 336.22, standoff -114.17, extent 201,-49.99 301,50.01
3D body "PLS-1.step": height 336.22, standoff -114.17, extent 101,-49.99 201,50.01
3D body "PLS-1.step": height 336.22, standoff -114.17, extent -99,-49.99 1,50.01
3D body "PLS-1.step": height 336.22, standoff -114.17, extent -299,-49.99 -199,50.01
3D body "PLS-1.step": height 336.22, standoff -114.17, extent -899,-49.99 -799,50.01
3D body "PLS-1.step": height 336.22, standoff -114.17, extent -999,-49.99 -899,50.01
3D body "PLS-1.step": height 336.22, standoff -114.17, extent -799,-49.99 -699,50.01
3D body "PLS-1.step": height 336.22, standoff -114.17, extent -699,-49.99 -599,50.01
3D body "PLS-1.step": height 336.22, standoff -114.17, extent -599,-49.99 -499,50.01
3D body "PLS-1.step": height 336.22, standoff -114.17, extent -499,-49.99 -399,50.01
3D body "PLS-1.step": height 336.22, standoff -114.17, extent -399,-49.99 -299,50.01
3D body "PLS-1.step": height 336.22, standoff -114.17, extent -199,-49.99 -99,50.01
3D body "PLS-1.step": height 336.22, standoff -114.17, extent 1,-49.99 101,50.01
3D body "PLS-1.step": height 336.22, standoff -114.17, extent 301,-49.99 401,50.01
3D body "PLS-1.step": height 336.22, standoff -114.17, extent 501,-49.99 601,50.01
3D body "PLS-1.step": height 336.22, standoff -114.17, extent 701,-49.99 801,50.01
3D body "PLS-1.step": height 336.22, standoff -114.17, extent 901,-49.99 1001,50.01